# Altium footprint library Toi Library.PcbLib: 740 footprints (part 22 of 47)
Each footprint in its own frame and in the unit in brackets; x right, y up, seen from the top. Pads: shape width x height; smd on the part's side, far side on the other; paste and mask are expansions set on the pad; w line width, h text height; cw(c..) or ccw(c..) is an arc to the next point about the centre after c.
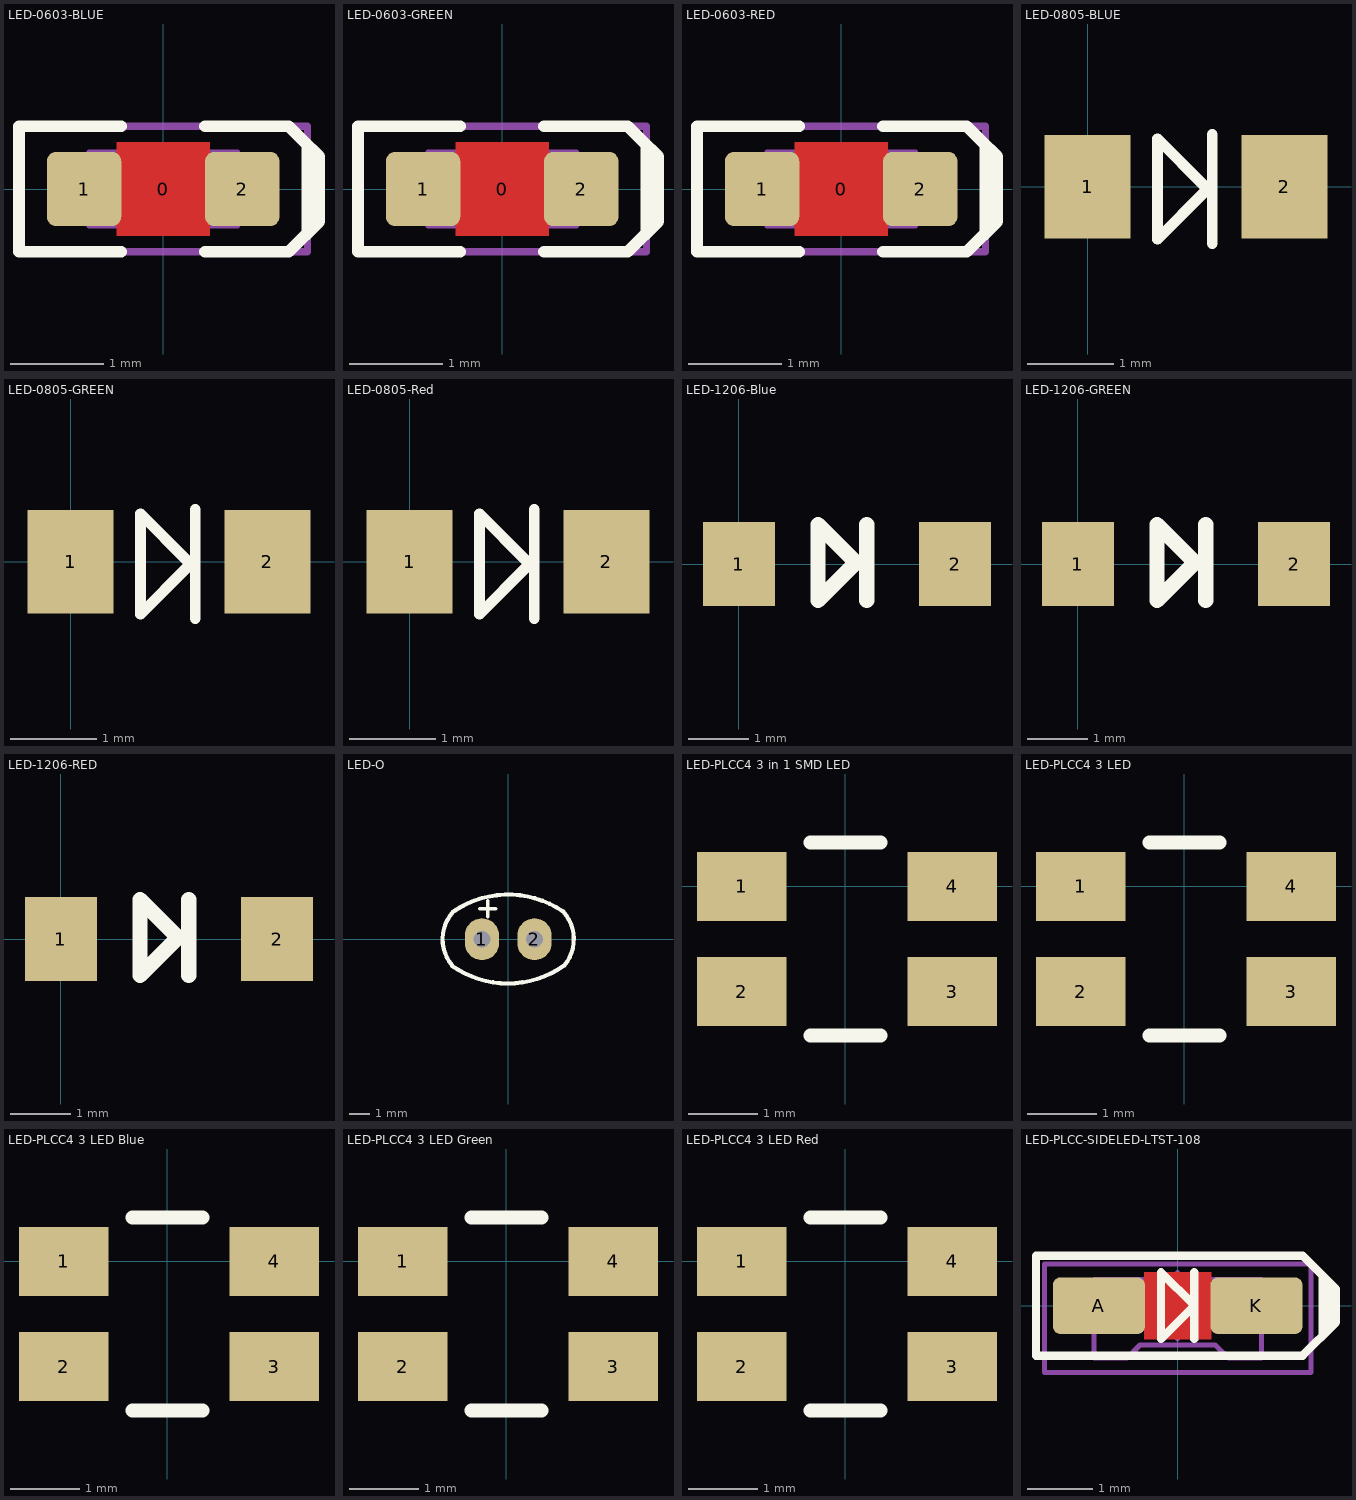
[diagram p21: the footprints below, top view; thin cyan lines are the x and y axes]

## LED-0603-BLUE [mm]
height 0.8
pads (3):
  round 0.254 on Mech15: 0(0,0)
  rrect25% 0.8x0.8 smd: 1(-0.85,0) 2(0.85,0)
Top Layer:
  pour cut-out: -0.5,0.5 0.5,0.5 0.5,-0.5 -0.5,-0.5
Top Overlay:
  lines w0.127: -0.45,-0.675 -1.55,-0.675 -1.55,0.675 -0.45,0.675 ; 0.45,-0.675 1.35,-0.675 1.55,-0.475 1.55,0.475 1.35,0.675 0.45,0.675 ; 1.5,0.525 1.675,0.35 1.675,-0.35 1.525,-0.5
Mechanical 13:
  lines w0.05: -0.6,-0.4 -0.6,0.399 0.6,0.4 0.6,-0.4 -0.6,-0.399 ; -0.505,-0.398 -0.505,0.398 ; -0.5,-0.4 -0.8,-0.4 -0.8,0.4 -0.5,0.4 ; 0.5,-0.4 0.8,-0.4 0.8,0.4 0.5,0.4 ; 0.505,-0.398 0.505,0.398 ; -0.599,-0.398 -0.599,0.398 0.599,0.398 0.599,-0.398 -0.599,-0.398
Mechanical 15:
  lines w0.076: -1.55,-0.675 -1.55,0.675 1.55,0.675 1.55,-0.675 -1.55,-0.675
3D body "LED 0603 APT1608 BLUE.STEP": height 0.75, standoff 0, extent -0.8,-0.4 0.8,0.4

## LED-0603-GREEN [mm]
height 0.8
pads (3):
  round 0.254 on Mech15: 0(0,0)
  rrect25% 0.8x0.8 smd: 1(-0.85,0) 2(0.85,0)
Top Layer:
  pour cut-out: -0.5,0.5 0.5,0.5 0.5,-0.5 -0.5,-0.5
Top Overlay:
  lines w0.127: -0.45,-0.675 -1.55,-0.675 -1.55,0.675 -0.45,0.675 ; 0.45,-0.675 1.35,-0.675 1.55,-0.475 1.55,0.475 1.35,0.675 0.45,0.675 ; 1.5,0.525 1.675,0.35 1.675,-0.35 1.525,-0.5
Mechanical 13:
  lines w0.05: -0.6,-0.4 -0.6,0.399 0.6,0.4 0.6,-0.4 -0.6,-0.399 ; -0.505,-0.398 -0.505,0.398 ; -0.5,-0.4 -0.8,-0.4 -0.8,0.4 -0.5,0.4 ; 0.5,-0.4 0.8,-0.4 0.8,0.4 0.5,0.4 ; 0.505,-0.398 0.505,0.398 ; -0.599,-0.398 0.599,-0.398 0.599,0.398 -0.599,0.398 -0.599,-0.398
Mechanical 15:
  lines w0.076: -1.55,-0.675 -1.55,0.675 1.55,0.675 1.55,-0.675 -1.55,-0.675
3D body "LED 0603 APT1608 GREEN.STEP": height 0.75, standoff 0, extent -0.8,-0.4 0.8,0.4

## LED-0603-RED [mm]
height 0.8
pads (3):
  round 0.254 on Mech15: 0(0,0)
  rrect25% 0.8x0.8 smd: 1(-0.85,0) 2(0.85,0)
Top Layer:
  pour cut-out: -0.5,0.5 0.5,0.5 0.5,-0.5 -0.5,-0.5
Top Overlay:
  lines w0.127: -0.45,-0.675 -1.55,-0.675 -1.55,0.675 -0.45,0.675 ; 0.45,-0.675 1.35,-0.675 1.55,-0.475 1.55,0.475 1.35,0.675 0.45,0.675 ; 1.5,0.525 1.675,0.35 1.675,-0.35 1.525,-0.5
Mechanical 13:
  lines w0.05: -0.6,-0.4 -0.6,0.399 0.6,0.4 0.6,-0.4 -0.6,-0.399 ; -0.505,-0.398 -0.505,0.398 ; -0.5,-0.4 -0.8,-0.4 -0.8,0.4 -0.5,0.4 ; 0.5,-0.4 0.8,-0.4 0.8,0.4 0.5,0.4 ; 0.505,-0.398 0.505,0.398 ; -0.599,-0.398 -0.599,0.398 0.599,0.398 0.599,-0.398 -0.599,-0.398
Mechanical 15:
  lines w0.076: -1.55,-0.675 1.55,-0.675 1.55,0.675 -1.55,0.675 -1.55,-0.675
3D body "LED 0603 APT1608 RED.STEP": height 0.75, standoff 0, extent -0.8,-0.4 0.8,0.4

## LED-0805-BLUE [mm]
pads (2):
  rect 1x1.2 smd: 1(0,0) 2(2.286,0)
Top Overlay:
  lines w0.127: 1.372,-0.051 0.813,-0.61 0.813,0.559 1.372,0 ; 1.448,-0.66 1.448,0.61
3D body "User Library-LED0805.STEP": height 0.8, standoff 0, extent 0.075,-0.675 2.175,0.675

## LED-0805-GREEN [mm]
pads (2):
  rect 1x1.2 smd: 1(0,0) 2(2.286,0)
Top Overlay:
  lines w0.127: 1.372,-0.051 0.813,-0.61 0.813,0.559 1.372,0 ; 1.448,-0.66 1.448,0.61
3D body "User Library-User Library-led_0805 GRE.STEP": height 1.1, standoff 0, extent 0.053,-0.625 2.073,0.625

## LED-0805-Red [mm]
pads (2):
  rect 1x1.2 smd: 1(0,0) 2(2.286,0)
Top Overlay:
  lines w0.127: 1.372,-0.051 0.813,-0.61 0.813,0.559 1.372,0 ; 1.448,-0.66 1.448,0.61
3D body "User Library-led_0805LED0805_red.STEP": height 1.1, standoff 0, extent 0.053,-0.625 2.073,0.625

## LED-1206-Blue [mm] "Compoment SMD 120x60mil"
height 1.27
pads (2):
  rect 1.2x1.4 smd: 1(0,0) 2(3.607,0)
Top Overlay:
  lines w0.254: 1.93,0 1.321,-0.61 1.321,0.66 1.93,0.051 ; 2.134,-0.61 2.134,0.66
3D body "SW3dPS-LED1206G.STEP": height 1.11, standoff -0.4, extent 0.15,-0.813 3.35,0.788

## LED-1206-GREEN [mm] "Compoment SMD 120x60mil"
height 1.27
pads (2):
  rect 1.2x1.4 smd: 1(0,0) 2(3.607,0)
Top Overlay:
  lines w0.254: 1.93,0 1.321,-0.61 1.321,0.66 1.93,0.051 ; 2.134,-0.61 2.134,0.66
3D body "User Library-LED 1206 BLUE.STEP": height 1.1, standoff 0, extent 0.15,-0.8 3.35,0.8

## LED-1206-RED [mm] "Compoment SMD 120x60mil"
height 1.27
pads (2):
  rect 1.2x1.4 smd: 1(0,0) 2(3.607,0)
Top Overlay:
  lines w0.254: 1.93,0 1.321,-0.61 1.321,0.66 1.93,0.051 ; 2.134,-0.61 2.134,0.66
3D body "SW3dPS-LED1206R.STEP": height 1.11, standoff -0.4, extent 0.188,-0.813 3.389,0.787

## LED-O [mil] "LED 2 PIN,  Ovan Only colour, pin to pin 110mil"
height 300
pads (2):
  oval 65x80 hole 32: 1(-50,0) 2(50,0)
Top Overlay:
  lines w7: -54,58 -24,58 ; -39,43 -39,73
  lines w8: -106.82,-49.85 cw(c-47,0) -104.5,52.5 ; -106.38,-51.11 ccw(c-0.81,100.81) 104.97,-50.96 ; -102.83,53.79 cw(c0,-100) 103.93,53.04 ; 104.5,52.5 cw(c47,0) 106.82,-49.85

## LED-PLCC4 3 in 1 SMD LED [mm] "Led SMD Blanco"
pads (4):
  rect 1.3x1 smd: 1(-1.5,0) 2(-1.5,-1.524) 3(1.548,-1.524) 4(1.548,0)
Top Overlay:
  lines w0.203: -0.508,-2.159 0.508,-2.159 ; -0.508,0.635 0.508,0.635
  text "." at -1.905,0.762 h2.29
Mechanical 1:
  text "+" at -2.413,0.127 h0.25
3D body "PLCC4RGBCT-CA LED SMD RGB.step": height 1.91, standoff 0.01, extent -1.75,-2.159 1.75,0.641

## LED-PLCC4 3 LED [mm] "Led SMD Blanco"
pads (4):
  rect 1.3x1 smd: 1(-1.5,0) 2(-1.5,-1.524) 3(1.548,-1.524) 4(1.548,0)
Top Overlay:
  lines w0.203: -0.508,-2.159 0.508,-2.159 ; -0.508,0.635 0.508,0.635
  text "." at -1.905,0.762 h2.29
Mechanical 1:
  text "+" at -2.413,0.127 h0.25
3D body "Osram_Led_PLCC4-1.step": height 1.96, standoff 0.01, extent -1.75,-2.165 1.75,0.635

## LED-PLCC4 3 LED Blue [mm] "Led SMD Blanco"
pads (4):
  rect 1.3x1 smd: 1(-1.5,0) 2(-1.5,-1.524) 3(1.548,-1.524) 4(1.548,0)
Top Overlay:
  lines w0.203: -0.508,-2.159 0.508,-2.159 ; -0.508,0.635 0.508,0.635
  text "." at -1.905,0.762 h2.29
Mechanical 1:
  text "+" at -2.413,0.127 h0.25
3D body "Osram_Led_PLCC4Blue.step": height 1.96, standoff 0.01, extent -1.75,-2.162 1.75,0.638

## LED-PLCC4 3 LED Green [mm] "Led SMD Blanco"
pads (4):
  rect 1.3x1 smd: 1(-1.5,0) 2(-1.5,-1.524) 3(1.548,-1.524) 4(1.548,0)
Top Overlay:
  lines w0.203: -0.508,-2.159 0.508,-2.159 ; -0.508,0.635 0.508,0.635
  text "." at -1.905,0.762 h2.29
Mechanical 1:
  text "+" at -2.413,0.127 h0.25
3D body "Osram_Led_PLCC4verde.step": height 1.96, standoff 0.01, extent -1.75,-2.162 1.75,0.638

## LED-PLCC4 3 LED Red [mm] "Led SMD Blanco"
pads (4):
  rect 1.3x1 smd: 1(-1.5,0) 2(-1.5,-1.524) 3(1.548,-1.524) 4(1.548,0)
Top Overlay:
  lines w0.203: -0.508,-2.159 0.508,-2.159 ; -0.508,0.635 0.508,0.635
  text "." at -1.905,0.762 h2.29
Mechanical 1:
  text "+" at -2.413,0.127 h0.25
3D body "Osram_Led_PLCC4-red.step": height 1.96, standoff 0.01, extent -1.75,-2.162 1.75,0.638

## LED-PLCC-SIDELED-LTST-108 [mm] "Lite-On Inc PLCC Side LED"
height 0.8
pads (2):
  rrect25% 1.4x0.86 smd: A(-1.2,0) K(1.2,0)
Top Layer:
  pour cut-out: -0.508,0.508 0.508,0.508 0.508,-0.508 -0.508,-0.508
Top Overlay:
  lines w0.127: 0.254,-0.508 0.254,0.508 ; 2.21,-0.457 2.21,0.457 ; 2.311,-0.356 2.311,0.356 ; -2.159,-0.762 -2.159,0.762 1.905,0.762 2.413,0.254 2.413,-0.254 1.905,-0.762 -2.159,-0.762 ; -0.254,-0.508 0.254,0 -0.254,0.508 -0.254,-0.508
Mechanical 13:
  lines w0.076: -1.275,-0.8 -0.775,-0.8 -0.575,-0.6 0.575,-0.6 0.775,-0.8 1.275,-0.8 1.275,0.4 -1.275,0.4 -1.275,-0.8
Mechanical 15:
  lines w0.076: -0.508,0 0.508,0 ; 0,-0.508 0,0.508 ; -2.032,-1.016 -2.032,0.635 2.032,0.635 2.032,-1.016 -2.032,-1.016
3D body: height 0.8, standoff 0, extent -1.275,-0.8 1.275,0.4
3D body: height 0.15, standoff 0, extent -1.425,-0.3 -0.725,0.3
3D body: height 0.15, standoff 0, extent 0.725,-0.3 1.425,0.3